# Altium footprint library Sajad_Altium_Library.PcbLib: 333 footprints (part 10 of 21)
Each footprint in its own frame and in the unit in brackets; x right, y up, seen from the top. Pads: shape width x height; smd on the part's side, far side on the other; paste and mask are expansions set on the pad; w line width, h text height; cw(c..) or ccw(c..) is an arc to the next point about the centre after c.
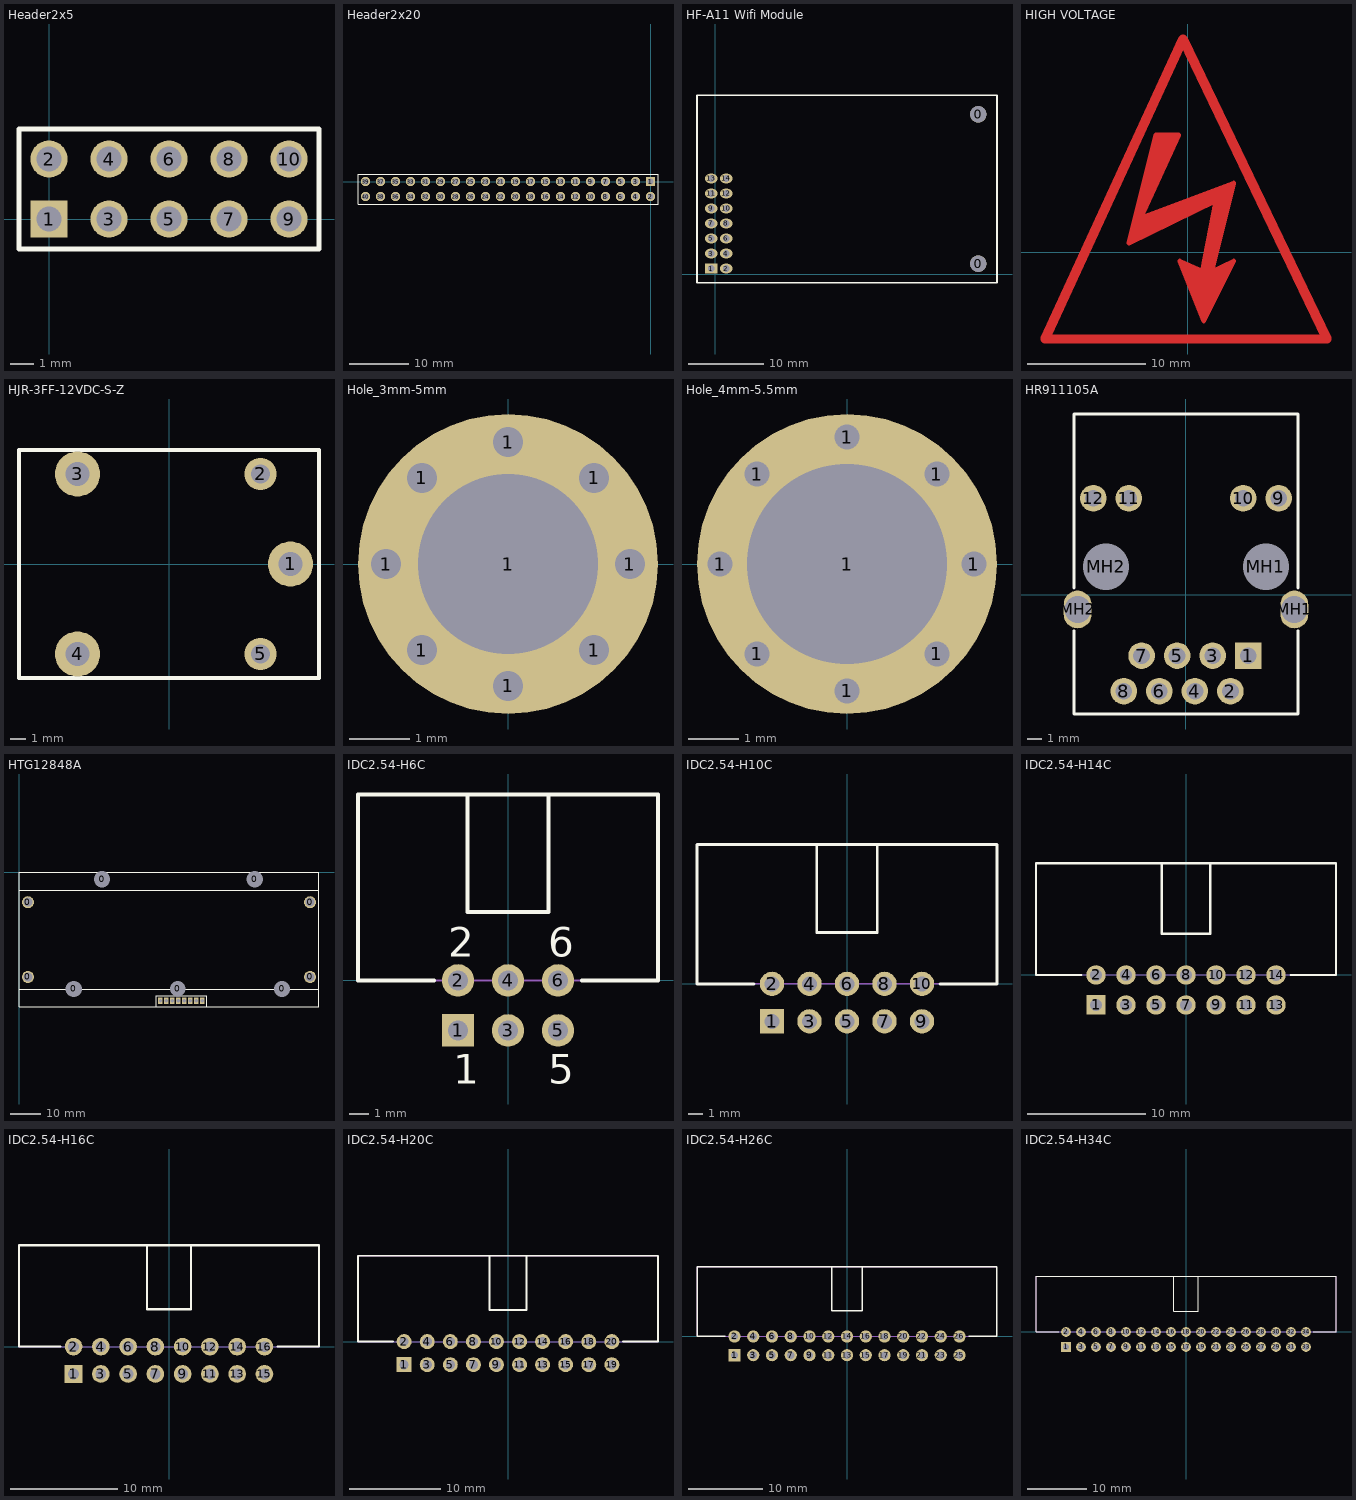
[diagram p9: the footprints below, top view; thin cyan lines are the x and y axes]

## Header2x5 [mil]
pads (10):
  rect 62x62 hole 42: 1(0,0)
  round 62 hole 42: 2(0,100) 3(100,0) 4(100,100) 5(200,0) 6(200,100) 7(300,0) 8(300,100) 9(400,0) 10(400,100)
Top Overlay:
  lines w7.87: -50,-50 450,-50 450,150 -50,150 -50,-50
3D body: height 330, standoff -150, extent -50,-55 450,145
3D body: height 330, standoff -150, extent -50,-50 450,150

## Header2x20 [mil]
pads (40):
  rect 62x62 hole 42: 1(0,0)
  round 62 hole 42: 2(0,-100) 3(-100,0) 4(-100,-100) 5(-200,0) 6(-200,-100) 7(-300,0) 8(-300,-100) 9(-400,0) 10(-400,-100) 11(-500,0) 12(-500,-100) 13(-600,0) 14(-600,-100) 15(-700,0) 16(-700,-100) 17(-800,0) 18(-800,-100) 19(-900,0) 20(-900,-100) 21(-1000,0) 22(-1000,-100) 23(-1100,0) 24(-1100,-100) 25(-1200,0) 26(-1200,-100) 27(-1300,0) 28(-1300,-100) 29(-1400,0) 30(-1400,-100) 31(-1500,0) 32(-1500,-100) 33(-1600,0) 34(-1600,-100) 35(-1700,0) 36(-1700,-100) 37(-1800,0) 38(-1800,-100) 39(-1900,0) 40(-1900,-100)
Top Overlay:
  lines w7.87: -1950,-150 -1950,50 50,50 50,-150 -1950,-150
3D body: height 374.02, standoff -125.98, extent -1949.99,-148.42 50.01,48.43

## HF-A11 Wifi Module [mil] "HF-A11 Wifi Module"
pads (16):
  round 86.61 hole 86.61: 0(1380,56.54) 0(1380,840)
  rect 65x50 hole 35: 1(-21.57,30.94)
  oval 65x50 hole 35: 2(57.17,30.94) 3(-21.57,109.69) 4(57.17,109.69) 5(-21.57,188.43) 6(57.17,188.43) 7(-21.57,267.17) 8(57.17,267.17) 9(-21.57,345.91) 10(57.17,345.91) 11(-21.57,424.65) 12(57.17,424.65) 13(-21.57,503.39) 14(57.17,503.39)
Top Overlay:
  lines w8: -96.38,-43.86 -96.38,940.39 1478.43,940.39 1478.43,-43.86 -96.38,-43.86

## HIGH VOLTAGE [mm]
Top Layer:
  lines w0.4: -3.962,4.216 -4.572,1.168 3.607,5.486 -3.658,2.667 -3.886,1.905 3.124,4.978 -3.835,2.235 2.946,4.724 2.083,1.702 2.642,4.801 3.556,4.801 1.702,-1.448 1.397,-5.309 3.48,-1.245 1.346,-2.235 -0.203,-1.194 1.27,-4.902 3.048,-1.676 1.854,-2.464 1.295,-1.575 0.94,-1.753 1.524,-1.499 1.143,-2.007 1.803,-3.81 2.464,-2.235 0.33,-1.829 1.27,-4.318 0.711,-2.108 1.422,-3.886 2.159,-2.413 0.94,-2.311 1.473,-3.277 1.905,-2.642 ; -1.118,9.779 -3.327,5.232 -1.372,9.83 -3.302,6.096 -1.626,9.677 -2.362,9.627 -2.972,7.518 -1.778,9.576 -2.337,9.195 -3.962,2.87 -0.737,9.906 ; -2.692,9.906 -4.953,0.737 2.388,4.318 1.245,-1.626 ; -2.692,9.906 -4.216,1.27 3.404,5.334 1.245,-1.626 ; -2.692,9.906 -0.737,9.906 ; -0.737,9.906 -4.216,2.794 3.912,5.842 2.032,-1.676 3.912,-0.762 1.372,-5.842 -0.66,-0.762 1.245,-1.626
  lines w0.8: -12.065,-7.366 -0.381,18.034 11.811,-7.366 -12.065,-7.366
  text "High Voltage" at -12.624,-11.963 h3

## HJR-3FF-12VDC-S-Z [mm]
pads (5):
  round 3 hole 1.6: 1(8.1,0) 3(-6.1,6) 4(-6.1,-6)
  round 2.159 hole 1.27: 2(6.1,6) 5(6.1,-6)
Top Overlay:
  lines w0.254: -10,-7.6 -10,7.6 10,7.6 10,-7.6 -10,-7.6
3D body: height 15, standoff -3, extent -9.712,-7.975 9.788,7.925

## Hole_3mm-5mm [mm]
height 2.8
pads (9):
  round 0.8 hole 0.5: 1(-2.032,0) 1(-1.437,-1.437) 1(-1.437,1.437) 1(0,-2.032) 1(0,2.032) 1(1.437,-1.437) 1(1.437,1.437) 1(2.032,0)
  round 5 hole 3: 1(0,0)

## Hole_4mm-5.5mm [mm]
height 2.8
pads (9):
  round 0.8 hole 0.5: 1(-2.54,0) 1(-1.796,-1.796) 1(-1.796,1.796) 1(0,-2.54) 1(0,2.54) 1(1.796,-1.796) 1(1.796,1.796) 1(2.54,0)
  round 6 hole 4: 1(0,0)

## HR911105A [mm] "Rj45 Connector with Filter & LED"
pads (16):
  rect 1.9x1.9 hole 1.2: 1(4.445,-4.355)
  round 1.9 hole 1.2: 2(3.175,-6.895) 3(1.905,-4.355) 4(0.635,-6.895) 5(-0.635,-4.355) 6(-1.905,-6.895) 7(-3.175,-4.355) 8(-4.445,-6.895) 9(6.625,6.895) 10(4.085,6.895) 11(-4.085,6.895) 12(-6.625,6.895)
  round 2.95 hole 3.302 unplated: MH1(5.715,1.995) MH2(-5.715,1.995)
  oval 2x2.7 hole 1.9: MH1(7.745,-1.055) MH2(-7.745,-1.055)
Top Overlay:
  lines w0.2: -8,-2.576 -8,-8.525 0,-8.525 8,-8.525 8,-2.576 ; -8,0.472 -8,12.915 8.001,12.915 ; 8,0.472 8,12.915
3D body: height 15.36, standoff -1.78, extent -8.13,-8.575 8.131,13.015

## HTG12848A [mm] "Glcd HTG12848A"
pads (17):
  round 4 hole 3: 0(3,-35) 0(3,-10) 0(97.3,-35) 0(97.3,-10)
  round 4 hole 5.4: 0(18.281,-39) 0(27.8,-2.3) 0(78.8,-2.3) 0(87.981,-39)
  round 4 hole 5.2: 0(53.131,-39)
  rect 1.5x2.2 hole 1.15: 1(47.3,-43) 2(49.3,-43) 3(51.3,-43) 4(53.3,-43) 5(55.3,-43) 6(57.3,-43) 7(59.3,-43) 8(61.3,-43)
Top Overlay:
  lines w0.254: 0,-39.05 100.3,-39.05 ; 0,-5.95 100.3,-5.95 ; 45.817,-44.99 45.817,-41.19 62.817,-41.19 62.817,-44.99 ; 0,-45 100.3,-45 100.3,0 0,0 0,-45

## IDC2.54-H6C [mm] "Connector; IDC, Low Profile Male Header, Thru-Hole; 6 Position; Right Angle; Pitch 2.54 mm; Body 15.24 x 8.9 x 9.2 mm (LxWxH)"
height 9.2
pads (6):
  rect 1.65x1.65 hole 1: 1(-2.54,-2.54)
  round 1.65 hole 1: 2(-2.54,0) 3(0,-2.54) 4(0,0) 5(2.54,-2.54) 6(2.54,0)
Top Overlay:
  lines w0.2: -3.765,0 -7.62,0 -7.62,9.45 7.62,9.45 7.62,0 3.765,0 ; -2.05,9.45 -2.05,3.48 2.05,3.48 2.05,9.45
  text "2" at -3.04,1.2 h1.5
  text "1" at -2.79,-5.24 h1.5
  text "6" at 2.04,1.2 h1.5
  text "5" at 2.04,-5.24 h1.5
Mechanical 13:
  lines w0.1: -7.62,0 7.62,0 7.62,9.45 -7.62,9.45 -7.62,0

## IDC2.54-H10C [mm] "Connector; IDC, Low Profile Male Header, Thru-Hole; 10 Position; Right Angle; Pitch 2.54 mm; Body 20.32 x 8.9 x 9.2 mm (LxWxH)"
height 9.2
pads (10):
  rect 1.65x1.65 hole 1: 1(-5.08,-2.54)
  round 1.65 hole 1: 2(-5.08,0) 3(-2.54,-2.54) 4(-2.54,0) 5(0,-2.54) 6(0,0) 7(2.54,-2.54) 8(2.54,0) 9(5.08,-2.54) 10(5.08,0)
Top Overlay:
  lines w0.2: -6.305,0 -10.16,0 -10.16,9.45 10.16,9.45 10.16,0 6.305,0 ; -2.05,9.45 -2.05,3.48 2.05,3.48 2.05,9.45
Mechanical 13:
  lines w0.1: -10.16,0 -10.16,9.45 10.16,9.45 10.16,0 -10.16,0

## IDC2.54-H14C [mm] "Connector; IDC, Low Profile Male Header, Thru-Hole; 14 Position; Right Angle; Pitch 2.54 mm; Body 25.40 x 8.9 x 9.2 mm (LxWxH)"
height 9.2
pads (14):
  rect 1.65x1.65 hole 1: 1(-7.62,-2.54)
  round 1.65 hole 1: 2(-7.62,0) 3(-5.08,-2.54) 4(-5.08,0) 5(-2.54,-2.54) 6(-2.54,0) 7(0,-2.54) 8(0,0) 9(2.54,-2.54) 10(2.54,0) 11(5.08,-2.54) 12(5.08,0) 13(7.62,-2.54) 14(7.62,0)
Top Overlay:
  lines w0.2: -8.845,0 -12.7,0 -12.7,9.45 12.7,9.45 12.7,0 8.845,0 ; -2.05,9.45 -2.05,3.48 2.05,3.48 2.05,9.45
Mechanical 13:
  lines w0.1: -12.7,0 -12.7,9.45 12.7,9.45 12.7,0 -12.7,0

## IDC2.54-H16C [mm] "Connector; IDC, Low Profile Male Header, Thru-Hole; 16 Position; Right Angle; Pitch 2.54 mm; Body 27.94 x 8.9 x 9.2 mm (LxWxH)"
height 9.2
pads (16):
  rect 1.65x1.65 hole 1: 1(-8.89,-2.54)
  round 1.65 hole 1: 2(-8.89,0) 3(-6.35,-2.54) 4(-6.35,0) 5(-3.81,-2.54) 6(-3.81,0) 7(-1.27,-2.54) 8(-1.27,0) 9(1.27,-2.54) 10(1.27,0) 11(3.81,-2.54) 12(3.81,0) 13(6.35,-2.54) 14(6.35,0) 15(8.89,-2.54) 16(8.89,0)
Top Overlay:
  lines w0.2: -10.115,0 -13.97,0 -13.97,9.45 13.97,9.45 13.97,0 10.115,0 ; -2.05,9.45 -2.05,3.48 2.05,3.48 2.05,9.45
Mechanical 13:
  lines w0.1: -13.97,0 13.97,0 13.97,9.45 -13.97,9.45 -13.97,0

## IDC2.54-H20C [mm] "Connector; IDC, Low Profile Male Header, Thru-Hole; 20 Position; Right Angle; Pitch 2.54 mm; Body 33.02 x 8.9 x 9.2 mm (LxWxH)"
height 9.2
pads (20):
  rect 1.65x1.65 hole 1: 1(-11.43,-2.54)
  round 1.65 hole 1: 2(-11.43,0) 3(-8.89,-2.54) 4(-8.89,0) 5(-6.35,-2.54) 6(-6.35,0) 7(-3.81,-2.54) 8(-3.81,0) 9(-1.27,-2.54) 10(-1.27,0) 11(1.27,-2.54) 12(1.27,0) 13(3.81,-2.54) 14(3.81,0) 15(6.35,-2.54) 16(6.35,0) 17(8.89,-2.54) 18(8.89,0) 19(11.43,-2.54) 20(11.43,0)
Top Overlay:
  lines w0.2: -12.655,0 -16.51,0 -16.51,9.45 16.51,9.45 16.51,0 12.655,0 ; -2.05,9.45 -2.05,3.48 2.05,3.48 2.05,9.45
Mechanical 13:
  lines w0.1: -16.51,0 -16.51,9.45 16.51,9.45 16.51,0 -16.51,0
3D body: height 8.58, standoff -2.82, extent -16.378,-2.819 16.322,9.831

## IDC2.54-H26C [mm] "Connector; IDC, Low Profile Male Header, Thru-Hole; 26 Position; Right Angle; Pitch 2.54 mm; Body 40.64 x 8.9 x 9.2 mm (LxWxH)"
height 9.2
pads (26):
  rect 1.65x1.65 hole 1: 1(-15.24,-2.54)
  round 1.65 hole 1: 2(-15.24,0) 3(-12.7,-2.54) 4(-12.7,0) 5(-10.16,-2.54) 6(-10.16,0) 7(-7.62,-2.54) 8(-7.62,0) 9(-5.08,-2.54) 10(-5.08,0) 11(-2.54,-2.54) 12(-2.54,0) 13(0,-2.54) 14(0,0) 15(2.54,-2.54) 16(2.54,0) 17(5.08,-2.54) 18(5.08,0) 19(7.62,-2.54) 20(7.62,0) 21(10.16,-2.54) 22(10.16,0) 23(12.7,-2.54) 24(12.7,0) 25(15.24,-2.54) 26(15.24,0)
Top Overlay:
  lines w0.2: -16.465,0 -20.32,0 -20.32,9.45 20.32,9.45 20.32,0 16.465,0 ; -2.05,9.45 -2.05,3.48 2.05,3.48 2.05,9.45
Mechanical 13:
  lines w0.1: -20.32,0 -20.32,9.45 20.32,9.45 20.32,0 -20.32,0

## IDC2.54-H34C [mm] "Connector; IDC, Low Profile Male Header, Thru-Hole; 34 Position; Right Angle; Pitch 2.54 mm; Body 50.80 x 8.9 x 9.2 mm (LxWxH)"
height 9.2
pads (34):
  rect 1.65x1.65 hole 1: 1(-20.32,-2.54)
  round 1.65 hole 1: 2(-20.32,0) 3(-17.78,-2.54) 4(-17.78,0) 5(-15.24,-2.54) 6(-15.24,0) 7(-12.7,-2.54) 8(-12.7,0) 9(-10.16,-2.54) 10(-10.16,0) 11(-7.62,-2.54) 12(-7.62,0) 13(-5.08,-2.54) 14(-5.08,0) 15(-2.54,-2.54) 16(-2.54,0) 17(0,-2.54) 18(0,0) 19(2.54,-2.54) 20(2.54,0) 21(5.08,-2.54) 22(5.08,0) 23(7.62,-2.54) 24(7.62,0) 25(10.16,-2.54) 26(10.16,0) 27(12.7,-2.54) 28(12.7,0) 29(15.24,-2.54) 30(15.24,0) 31(17.78,-2.54) 32(17.78,0) 33(20.32,-2.54) 34(20.32,0)
Top Overlay:
  lines w0.2: -21.545,0 -25.4,0 -25.4,9.45 25.4,9.45 25.4,0 21.545,0 ; -2.05,9.45 -2.05,3.48 2.05,3.48 2.05,9.45
Mechanical 13:
  lines w0.1: -25.4,0 -25.4,9.45 25.4,9.45 25.4,0 -25.4,0
3D body: height 9.2, standoff 0, extent -25.4,0 25.4,9.45